# Altium footprint library Chestin_PcbLib.PcbLib: 203 footprints (part 5 of 13)
Each footprint in its own frame and in the unit in brackets; x right, y up, seen from the top. Pads: shape width x height; smd on the part's side, far side on the other; paste and mask are expansions set on the pad; w line width, h text height; cw(c..) or ccw(c..) is an arc to the next point about the centre after c.
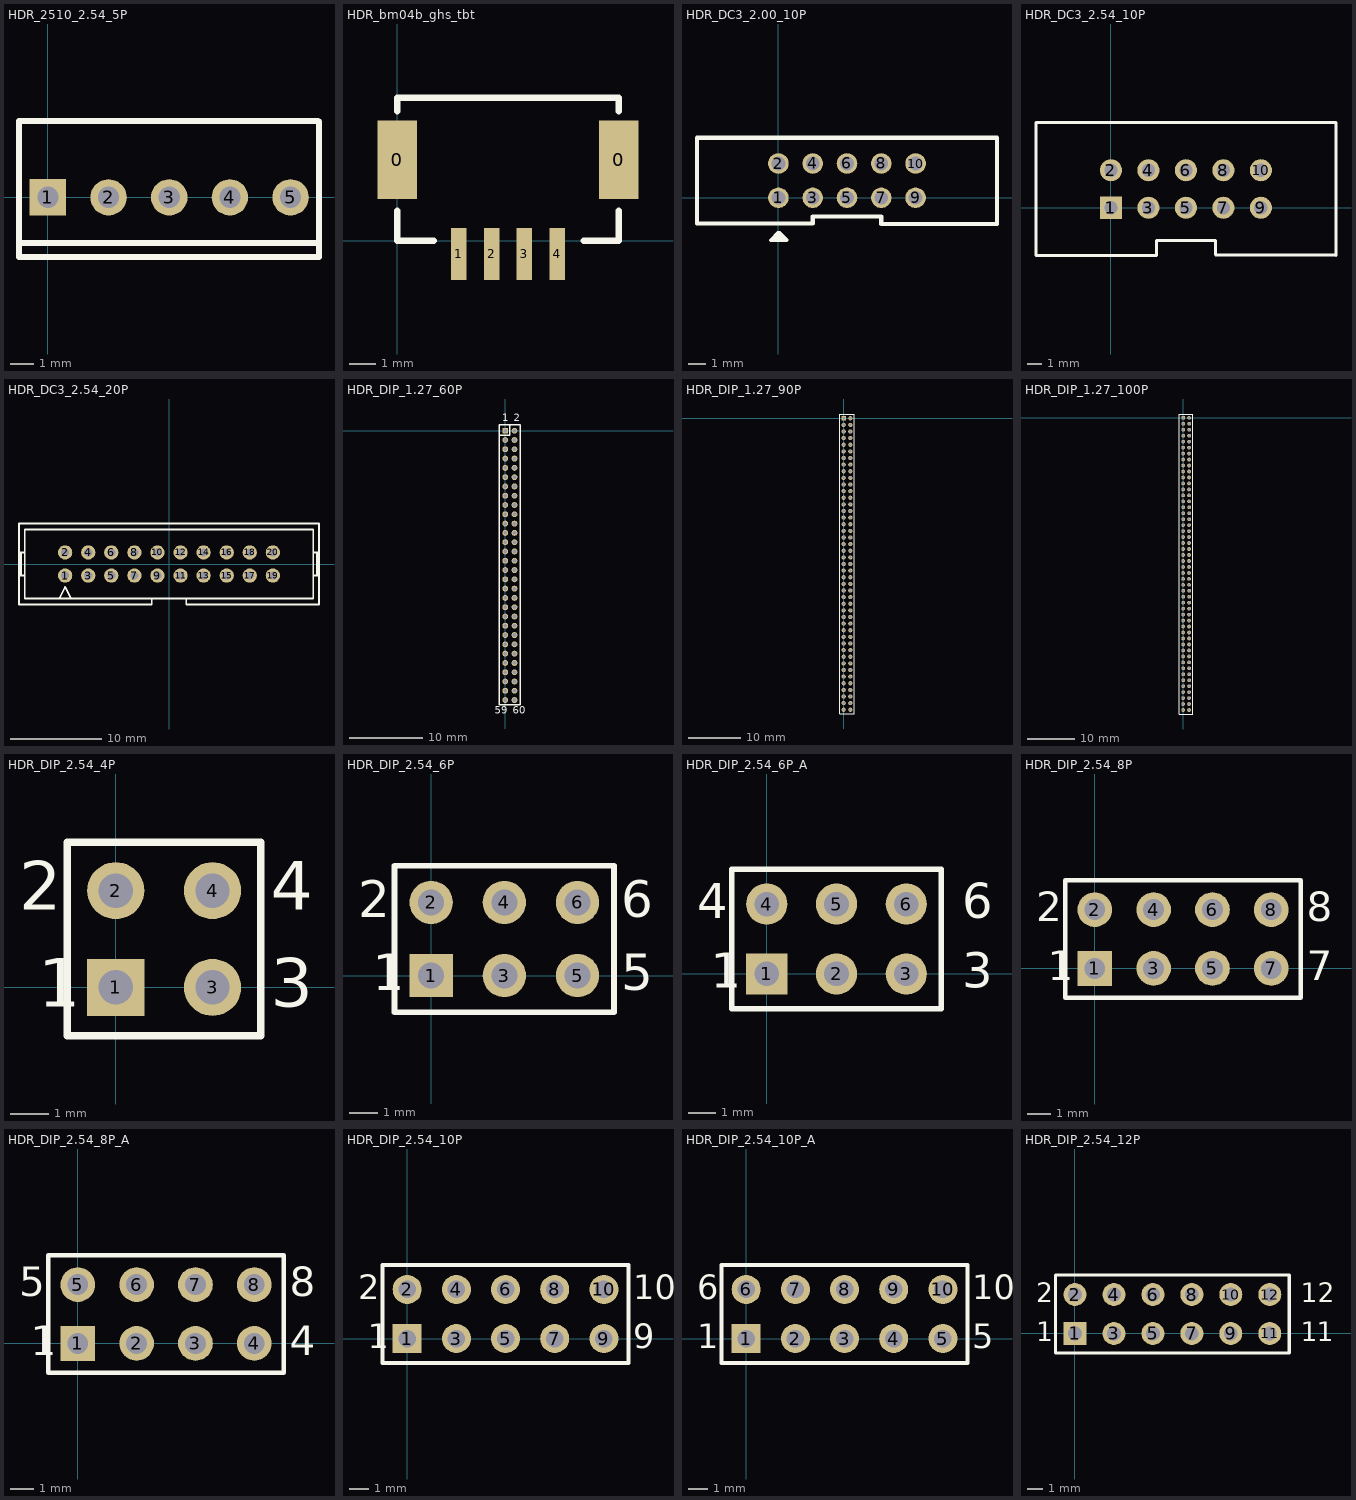
[diagram p4: the footprints below, top view; thin cyan lines are the x and y axes]

## HDR_2510_2.54_5P [mil]
pads (5):
  rect 60x60 hole 35: 1(0,0)
  round 60 hole 35: 2(100,0) 3(200,0) 4(300,0) 5(400,0)
Top Overlay:
  lines w10: -47.64,-75 444.88,-75 ; 444.88,-98.43 -47.64,-98.43 -47.64,125.98 444.88,125.98 ; 446.85,-98.43 446.85,125
3D body "接插件5p.STEP": height 458.27, standoff -137.8, extent -53.62,-106.58 443.63,120.59

## HDR_bm04b_ghs_tbt [mm]
pads (6):
  rect 1.5x3 smd: 0(0,3.1) 0(8.45,3.1)
  rect 0.6x2 smd: 1(2.35,-0.5) 2(3.6,-0.5) 3(4.85,-0.5) 4(6.1,-0.5)
Top Overlay:
  lines w0.254: 0,1.143 0,0 1.397,0 ; 0,4.953 0,5.461 8.45,5.461 8.45,4.953 ; 7.112,0 8.45,0 8.45,1.143

## HDR_DC3_2.00_10P [mm]
pads (10):
  round 1.2 hole 0.8: 1(-0.001,0.003) 2(-0.001,2.003) 3(1.999,0.003) 4(1.999,2.003) 5(3.999,0.003) 6(3.999,2.003) 7(5.999,0.003) 8(5.999,2.003) 9(7.999,0.003) 10(7.999,2.003)
Top Overlay:
  lines w0.2: 0.311,-2.284 -0.236,-2.284 -0.249,-2.271 0.105,-2.271 0.201,-2.174 0.201,-2.245 -0.026,-2.472 -0.026,-2.047 -0.001,-2.022 ; -0.001,-2.022 -0.451,-2.472 0.299,-2.472 0.499,-2.472 0.049,-2.022 -0.001,-2.022
  lines w0.254: 12.749,-1.522 5.999,-1.522 5.999,-1.093 1.999,-1.093 1.999,-1.497 -4.751,-1.497 -4.751,3.503 12.749,3.503 12.749,-1.497
3D body "IDC10S-H.STEP": height 5.5, standoff -2.5, extent -4.563,-1.785 12.437,3.715

## HDR_DC3_2.54_10P [mm]
pads (10):
  rect 1.5x1.5 hole 0.9: 1(0,0)
  round 1.5 hole 0.9: 2(0,2.54) 3(2.54,0) 4(2.54,2.54) 5(5.08,0) 6(5.08,2.54) 7(7.62,0) 8(7.62,2.54) 9(10.16,0) 10(10.16,2.54)
Top Overlay:
  lines w0.2: 15.24,-3.23 15.24,5.766 ; 15.24,5.77 -5.08,5.77 -5.08,-3.225 3.08,-3.225 3.08,-2.23 7.08,-2.23 7.08,-3.18 7.1,-3.2 15.25,-3.2
3D body "ps_key.STEP": height 8.88, standoff -3.31, extent -5.139,-3.556 15.291,5.334

## HDR_DC3_2.54_20P [mil]
pads (20):
  round 62 hole 35: 1(-450,-50) 2(-450,50) 3(-350,-50) 4(-350,50) 5(-250,-50) 6(-250,50) 7(-150,-50) 8(-150,50) 9(-50,-50) 10(-50,50) 11(50,-50) 12(50,50) 13(150,-50) 14(150,50) 15(250,-50) 16(250,50) 17(350,-50) 18(350,50) 19(450,-50) 20(450,50)
Top Overlay:
  lines w8: -650,-50 -625,-50 ; -650,50 -625,50 ; -641.67,-50 -641.67,50 ; -475,-150 -450,-100 -425,-150 ; -339.57,-175 -75,-175 -75,-150 ; -325,-175 -650,-175 -650,175 650,175 650,-175 325,-175 75,-175 75,-150 ; 625,-50 650,-50 ; 625,50 650,50 ; 641.67,-50 641.67,50 ; -75,-150 75,-150 ; -75,-150 -625,-150 -625,150 625,150 625,-150 75,-150

## HDR_DIP_1.27_60P [mm]
pads (60):
  rect 0.8x0.8 hole 0.5: 1(0,0)
  round 0.8 hole 0.5: 2(1.27,0) 3(0,-1.27) 4(1.27,-1.27) 5(0,-2.54) 6(1.27,-2.54) 7(0,-3.81) 8(1.27,-3.81) 9(0,-5.08) 10(1.27,-5.08) 11(0,-6.35) 12(1.27,-6.35) 13(0,-7.62) 14(1.27,-7.62) 15(0,-8.89) 16(1.27,-8.89) 17(0,-10.16) 18(1.27,-10.16) 19(0,-11.43) 20(1.27,-11.43) 21(0,-12.7) 22(1.27,-12.7) 23(0,-13.97) 24(1.27,-13.97) 25(0,-15.24) 26(1.27,-15.24) 27(0,-16.51) 28(1.27,-16.51) 29(0,-17.78) 30(1.27,-17.78) 31(0,-19.05) 32(1.27,-19.05) 33(0,-20.32) 34(1.27,-20.32) 35(0,-21.59) 36(1.27,-21.59) 37(0,-22.86) 38(1.27,-22.86) 39(0,-24.13) 40(1.27,-24.13) 41(0,-25.4) 42(1.27,-25.4) 43(0,-26.67) 44(1.27,-26.67) 45(0,-27.94) 46(1.27,-27.94) 47(0,-29.21) 48(1.27,-29.21) 49(0,-30.48) 50(1.27,-30.48) 51(0,-31.75) 52(1.27,-31.75) 53(0,-33.02) 54(1.27,-33.02) 55(0,-34.29) 56(1.27,-34.29) 57(0,-35.56) 58(1.27,-35.56) 59(0,-36.83) 60(1.27,-36.83)
Top Overlay:
  lines w0.2: -0.813,-0.635 0.635,-0.635 0.635,0.813 ; -0.813,-37.465 -0.813,0.813 2.032,0.813 2.032,-37.465 -0.813,-37.465
  text "1" at -0.381,1.27 h1.02
  text "2" at 1.143,1.27 h1.02
  text "59" at -1.397,-38.735 h1.02
  text "60" at 1.016,-38.735 h1.02

## HDR_DIP_1.27_90P [mm]
pads (90):
  rect 0.8x0.8 hole 0.5: 1(0,0)
  round 0.8 hole 0.5: 2(0,-1.27) 3(0,-2.54) 4(0,-3.81) 5(0,-5.08) 6(0,-6.35) 7(0,-7.62) 8(0,-8.89) 9(0,-10.16) 10(0,-11.43) 11(0,-12.7) 12(0,-13.97) 13(0,-15.24) 14(0,-16.51) 15(0,-17.78) 16(0,-19.05) 17(0,-20.32) 18(0,-21.59) 19(0,-22.86) 20(0,-24.13) 21(0,-25.4) 22(0,-26.67) 23(0,-27.94) 24(0,-29.21) 25(0,-30.48) 26(0,-31.75) 27(0,-33.02) 28(0,-34.29) 29(0,-35.56) 30(0,-36.83) 31(0,-38.1) 32(0,-39.37) 33(0,-40.64) 34(0,-41.91) 35(0,-43.18) 36(0,-44.45) 37(0,-45.72) 38(0,-46.99) 39(0,-48.26) 40(0,-49.53) 41(0,-50.8) 42(0,-52.07) 43(0,-53.34) 44(0,-54.61) 45(0,-55.88) 46(1.27,-55.88) 47(1.27,-54.61) 48(1.27,-53.34) 49(1.27,-52.07) 50(1.27,-50.8) 51(1.27,-49.53) 52(1.27,-48.26) 53(1.27,-46.99) 54(1.27,-45.72) 55(1.27,-44.45) 56(1.27,-43.18) 57(1.27,-41.91) 58(1.27,-40.64) 59(1.27,-39.37) 60(1.27,-38.1) 61(1.27,-36.83) 62(1.27,-35.56) 63(1.27,-34.29) 64(1.27,-33.02) 65(1.27,-31.75) 66(1.27,-30.48) 67(1.27,-29.21) 68(1.27,-27.94) 69(1.27,-26.67) 70(1.27,-25.4) 71(1.27,-24.13) 72(1.27,-22.86) 73(1.27,-21.59) 74(1.27,-20.32) 75(1.27,-19.05) 76(1.27,-17.78) 77(1.27,-16.51) 78(1.27,-15.24) 79(1.27,-13.97) 80(1.27,-12.7) 81(1.27,-11.43) 82(1.27,-10.16) 83(1.27,-8.89) 84(1.27,-7.62) 85(1.27,-6.35) 86(1.27,-5.08) 87(1.27,-3.81) 88(1.27,-2.54) 89(1.27,-1.27) 90(1.27,0)
Top Overlay:
  lines w0.102: -0.787,-56.693 -0.787,0.813 2.057,0.813 2.057,-56.693 -0.787,-56.693

## HDR_DIP_1.27_100P [mm]
pads (100):
  rect 0.8x0.8 hole 0.5: 1(0,0)
  round 0.8 hole 0.5: 2(0,-1.27) 3(0,-2.54) 4(0,-3.81) 5(0,-5.08) 6(0,-6.35) 7(0,-7.62) 8(0,-8.89) 9(0,-10.16) 10(0,-11.43) 11(0,-12.7) 12(0,-13.97) 13(0,-15.24) 14(0,-16.51) 15(0,-17.78) 16(0,-19.05) 17(0,-20.32) 18(0,-21.59) 19(0,-22.86) 20(0,-24.13) 21(0,-25.4) 22(0,-26.67) 23(0,-27.94) 24(0,-29.21) 25(0,-30.48) 26(0,-31.75) 27(0,-33.02) 28(0,-34.29) 29(0,-35.56) 30(0,-36.83) 31(0,-38.1) 32(0,-39.37) 33(0,-40.64) 34(0,-41.91) 35(0,-43.18) 36(0,-44.45) 37(0,-45.72) 38(0,-46.99) 39(0,-48.26) 40(0,-49.53) 41(0,-50.8) 42(0,-52.07) 43(0,-53.34) 44(0,-54.61) 45(0,-55.88) 46(0,-57.15) 47(0,-58.42) 48(0,-59.69) 49(0,-60.96) 50(0,-62.23) 51(1.27,-62.23) 52(1.27,-60.96) 53(1.27,-59.69) 54(1.27,-58.42) 55(1.27,-57.15) 56(1.27,-55.88) 57(1.27,-54.61) 58(1.27,-53.34) 59(1.27,-52.07) 60(1.27,-50.8) 61(1.27,-49.53) 62(1.27,-48.26) 63(1.27,-46.99) 64(1.27,-45.72) 65(1.27,-44.45) 66(1.27,-43.18) 67(1.27,-41.91) 68(1.27,-40.64) 69(1.27,-39.37) 70(1.27,-38.1) 71(1.27,-36.83) 72(1.27,-35.56) 73(1.27,-34.29) 74(1.27,-33.02) 75(1.27,-31.75) 76(1.27,-30.48) 77(1.27,-29.21) 78(1.27,-27.94) 79(1.27,-26.67) 80(1.27,-25.4) 81(1.27,-24.13) 82(1.27,-22.86) 83(1.27,-21.59) 84(1.27,-20.32) 85(1.27,-19.05) 86(1.27,-17.78) 87(1.27,-16.51) 88(1.27,-15.24) 89(1.27,-13.97) 90(1.27,-12.7) 91(1.27,-11.43) 92(1.27,-10.16) 93(1.27,-8.89) 94(1.27,-7.62) 95(1.27,-6.35) 96(1.27,-5.08) 97(1.27,-3.81) 98(1.27,-2.54) 99(1.27,-1.27) 100(1.27,0)
Top Overlay:
  lines w0.2: -0.813,-63.068 2.032,-63.068 2.032,0.813 -0.813,0.813 -0.813,-63.068

## HDR_DIP_2.54_4P [mm] "Connector; Header; 2x2 Position"
pads (4):
  rect 1.5x1.5 hole 0.9: 1(0,0)
  round 1.5 hole 0.9: 2(0,2.54) 3(2.54,0) 4(2.54,2.54)
Top Overlay:
  lines w0.2: -1.27,-1.27 -1.27,3.81 3.81,3.81 3.81,-1.27 -1.27,-1.27
  text "1" at -2.032,-0.508 h1.27
  text "2" at -2.54,2.032 h1.27
  text "4" at 4.064,2.032 h1.27
  text "3" at 4.064,-0.508 h1.27

## HDR_DIP_2.54_6P [mm] "Connector; Header; 3x2 Position"
pads (6):
  rect 1.5x1.5 hole 0.9: 1(0,0)
  round 1.5 hole 0.9: 2(0,2.54) 3(2.54,0) 4(2.54,2.54) 5(5.08,0) 6(5.08,2.54)
Top Overlay:
  lines w0.2: 1.482,-1.27 6.35,-1.27 ; 6.35,-1.27 -1.27,-1.27 -1.27,3.81 6.35,3.81 6.35,-1.27
  text "1" at -2.032,-0.508 h1.27
  text "2" at -2.54,2.032 h1.27
  text "5" at 6.604,-0.508 h1.27
  text "6" at 6.604,2.032 h1.27

## HDR_DIP_2.54_6P_A [mm] "Connector; Header; 3x2 Position"
pads (6):
  rect 1.5x1.5 hole 0.9: 1(0,0)
  round 1.5 hole 0.9: 2(2.54,0) 3(5.08,0) 4(0,2.54) 5(2.54,2.54) 6(5.08,2.54)
Top Overlay:
  lines w0.2: -1.27,-1.27 6.35,-1.27 6.35,3.81 -1.27,3.81 -1.27,-1.27
  text "6" at 7.112,2.032 h1.27
  text "3" at 7.112,-0.508 h1.27
  text "1" at -2.032,-0.508 h1.27
  text "4" at -2.54,2.032 h1.27

## HDR_DIP_2.54_8P [mm] "Connector; Header; 4x2 Position"
pads (8):
  rect 1.5x1.5 hole 0.9: 1(0,0)
  round 1.5 hole 0.9: 2(0,2.54) 3(2.54,0) 4(2.54,2.54) 5(5.08,0) 6(5.08,2.54) 7(7.62,0) 8(7.62,2.54)
Top Overlay:
  lines w0.2: -1.27,-1.27 -1.27,3.81 8.89,3.81 8.89,-1.27 -1.27,-1.27
  text "8" at 9.144,2.032 h1.27
  text "7" at 9.144,-0.508 h1.27
  text "1" at -2.032,-0.508 h1.27
  text "2" at -2.54,2.032 h1.27

## HDR_DIP_2.54_8P_A [mm] "Connector; Header; 4x2 Position"
pads (8):
  rect 1.5x1.5 hole 0.9: 1(0,0)
  round 1.5 hole 0.9: 2(2.54,0) 3(5.08,0) 4(7.62,0) 5(0,2.54) 6(2.54,2.54) 7(5.08,2.54) 8(7.62,2.54)
Top Overlay:
  lines w0.2: -1.27,-1.27 8.89,-1.27 8.89,3.81 -1.27,3.81 -1.27,-1.27
  text "5" at -2.54,2.032 h1.27
  text "1" at -2.032,-0.508 h1.27
  text "4" at 9.144,-0.508 h1.27
  text "8" at 9.144,2.032 h1.27

## HDR_DIP_2.54_10P [mm] "Connector; Header; 5x2 Position"
pads (10):
  rect 1.5x1.5 hole 0.9: 1(0,0)
  round 1.5 hole 0.9: 2(0,2.54) 3(2.54,0) 4(2.54,2.54) 5(5.08,0) 6(5.08,2.54) 7(7.62,0) 8(7.62,2.54) 9(10.16,0) 10(10.16,2.54)
Top Overlay:
  lines w0.2: -1.27,-1.27 11.43,-1.27 11.43,3.81 -1.27,3.81 -1.27,-1.27
  text "10" at 11.684,2.032 h1.27
  text "9" at 11.684,-0.508 h1.27
  text "1" at -2.032,-0.508 h1.27
  text "2" at -2.54,2.032 h1.27

## HDR_DIP_2.54_10P_A [mm] "Connector; Header; 5x2 Position"
pads (10):
  rect 1.5x1.5 hole 0.9: 1(0,0)
  round 1.5 hole 0.9: 2(2.54,0) 3(5.08,0) 4(7.62,0) 5(10.16,0) 6(0,2.54) 7(2.54,2.54) 8(5.08,2.54) 9(7.62,2.54) 10(10.16,2.54)
Top Overlay:
  lines w0.2: -1.27,-1.27 -1.27,3.81 11.43,3.81 11.43,-1.27 -1.27,-1.27
  text "6" at -2.54,2.032 h1.27
  text "10" at 11.684,2.032 h1.27
  text "5" at 11.684,-0.508 h1.27
  text "1" at -2.54,-0.508 h1.27

## HDR_DIP_2.54_12P [mm] "Connector; Header; 6x2 Position"
pads (12):
  rect 1.5x1.5 hole 0.9: 1(0,0)
  round 1.5 hole 0.9: 2(0,2.54) 3(2.54,0) 4(2.54,2.54) 5(5.08,0) 6(5.08,2.54) 7(7.62,0) 8(7.62,2.54) 9(10.16,0) 10(10.16,2.54) 11(12.7,0) 12(12.7,2.54)
Top Overlay:
  lines w0.2: -1.27,-1.27 13.97,-1.27 13.97,3.81 -1.27,3.81 -1.27,-1.27
  text "12" at 14.732,2.032 h1.27
  text "1" at 15.748,-0.508 h1.27
  text "1" at 14.732,-0.508 h1.27
  text "1" at -2.54,-0.508 h1.27
  text "2" at -2.54,2.032 h1.27